# Altium footprint library STM32F0.PcbLib: 228 footprints (part 5 of 16)
Each footprint in its own frame and in the unit in brackets; x right, y up, seen from the top. Pads: shape width x height; smd on the part's side, far side on the other; paste and mask are expansions set on the pad; w line width, h text height; cw(c..) or ccw(c..) is an arc to the next point about the centre after c.
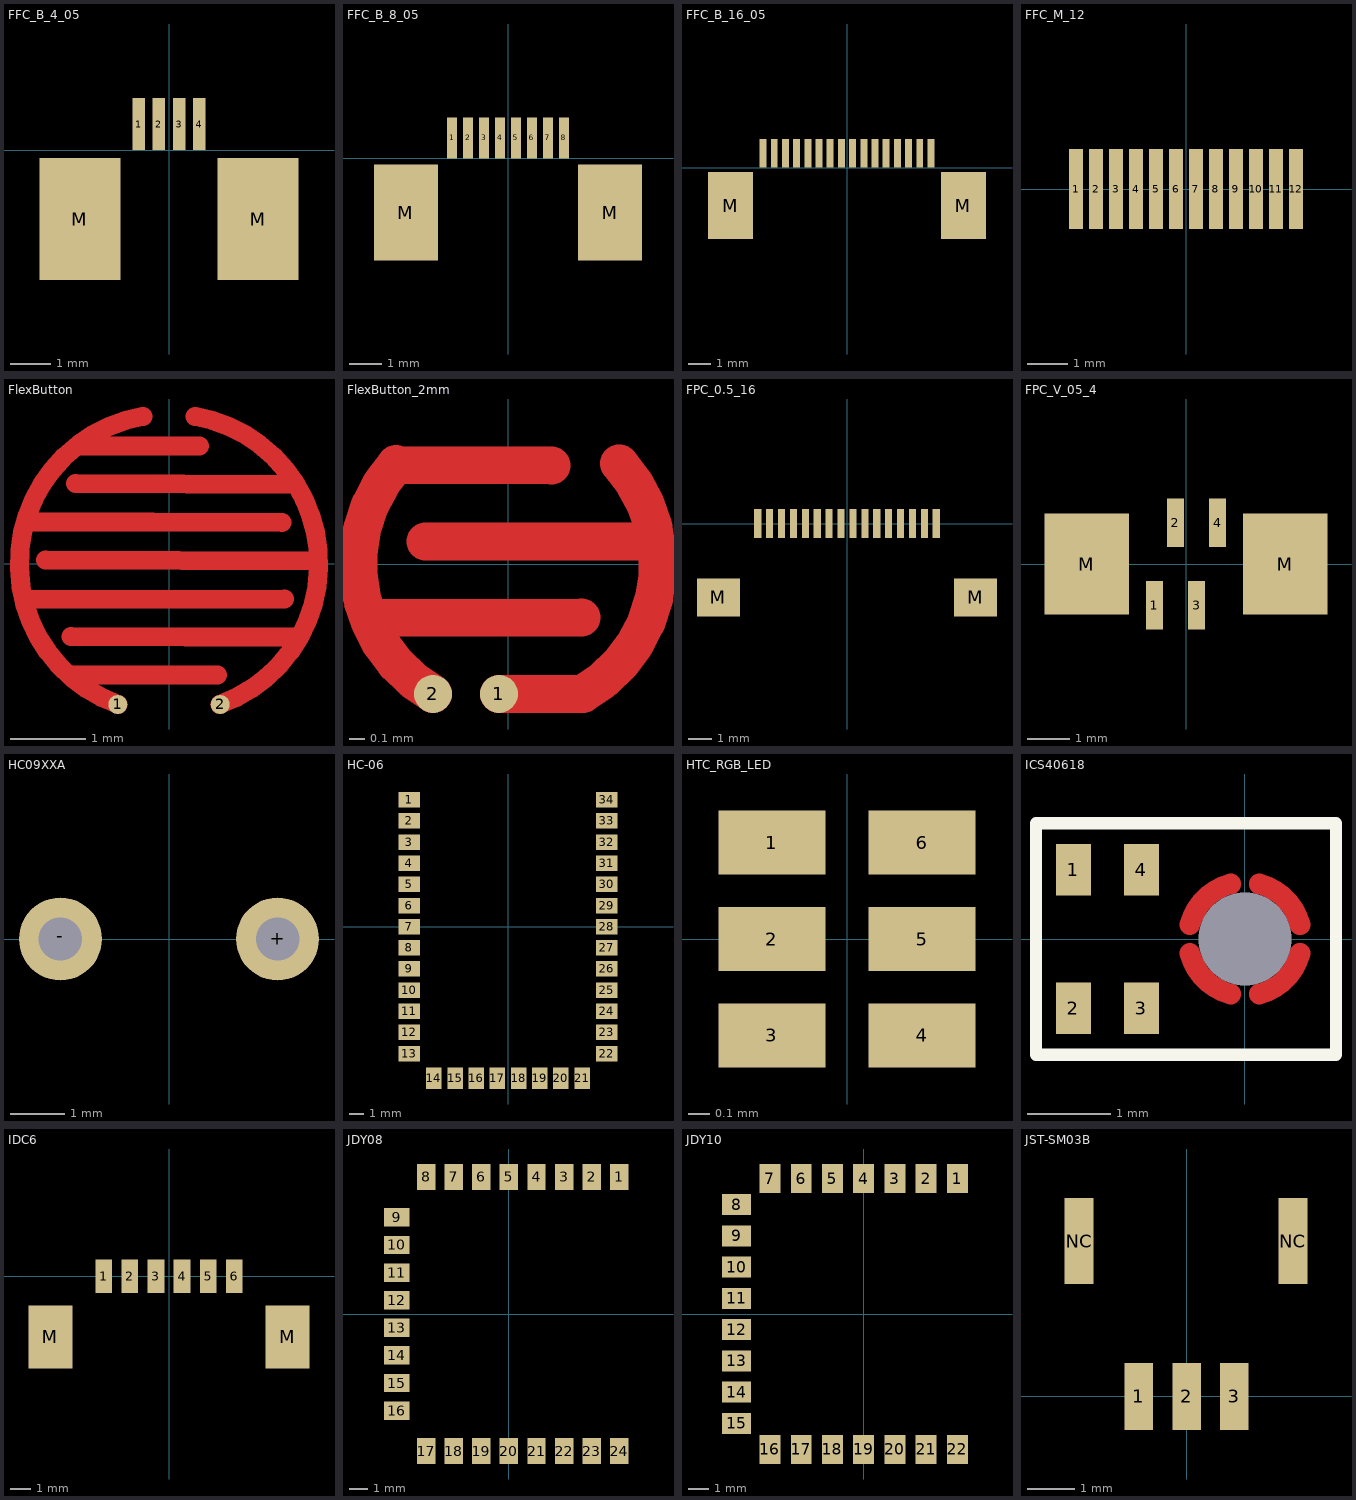
[diagram p4: the footprints below, top view; thin cyan lines are the x and y axes]

## FFC_B_4_05 [mm]
pads (6):
  rect 0.31x1.28 smd: 1(-0.75,0.64) 2(-0.25,0.64) 3(0.25,0.64) 4(0.75,0.64)
  rect 2x3 smd: M(-2.2,-1.7) M(2.2,-1.7)
3D body "52746-0471.stp": height 2, standoff -0.02, extent -4.05,-4.3 4.05,0.7

## FFC_B_8_05 [mm]
pads (10):
  rect 0.31x1.28 smd: 1(-1.75,0.64) 2(-1.25,0.64) 3(-0.75,0.64) 4(-0.25,0.64) 5(0.25,0.64) 6(0.75,0.64) 7(1.25,0.64) 8(1.75,0.64)
  rect 2x3 smd: M(-3.2,-1.7) M(3.2,-1.7)

## FFC_B_16_05 [mm]
pads (18):
  rect 0.31x1.28 smd: 1(-3.75,0.64) 2(-3.25,0.64) 3(-2.75,0.64) 4(-2.25,0.64) 5(-1.75,0.64) 6(-1.25,0.64) 7(-0.75,0.64) 8(-0.25,0.64) 9(0.25,0.64) 10(0.75,0.64) 11(1.25,0.64) 12(1.75,0.64) 13(2.25,0.64) 14(2.75,0.64) 15(3.25,0.64) 16(3.75,0.64)
  rect 2x3 smd: M(-5.2,-1.7) M(5.2,-1.7)

## FFC_M_12 [mm]
pads (12):
  rect 0.35x2 smd: 1(-2.75,0) 2(-2.25,0) 3(-1.75,0) 4(-1.25,0) 5(-0.75,0) 6(-0.25,0) 7(0.25,0) 8(0.75,0) 9(1.25,0) 10(1.75,0) 11(2.25,0) 12(2.75,0)

## FlexButton [mil]
pads (2):
  round 10 smd: 1(-26.93,-73.99) 2(26.93,-73.99)
Top Layer:
  lines w10: -75.98,-18.9 60.63,-18.55 ; -74.8,22.09 59.45,21.67 ; -64.96,1.96 77.16,1.52 ; -51.58,-58.37 25.59,-58.61 ; -51.58,-38.28 67.72,-38.64 ; -49.21,42.1 66.14,41.75 ; -48.43,61.81 16.14,61.99 ; -26.93,-73.99 cw(c0,0) -13.67,77.54 ; 13.67,77.54 cw(c0,0) 26.93,-73.99
Top Paste:
  lines w10: -75.98,-18.9 60.63,-18.55 ; -74.8,22.09 59.45,21.67 ; -64.96,1.96 77.16,1.52 ; -51.58,-58.37 25.59,-58.61 ; -51.58,-38.28 67.72,-38.64 ; -49.21,42.1 66.14,41.75 ; -48.43,61.81 16.14,61.99 ; -26.93,-73.99 cw(c0,0) -13.67,77.54 ; 13.67,77.54 cw(c0,0) 26.93,-73.99
Top Solder:
  lines w10: -75.98,-18.9 60.63,-18.55 ; -74.8,22.09 59.45,21.67 ; -64.96,1.96 77.16,1.52 ; -51.58,-58.37 25.59,-58.61 ; -51.58,-38.28 67.72,-38.64 ; -49.21,42.1 66.14,41.75 ; -48.43,61.81 16.14,61.99 ; -26.93,-73.99 cw(c0,0) -13.67,77.54 ; 13.67,77.54 cw(c0,0) 26.93,-73.99

## FlexButton_2mm [mil]
pads (2):
  round 10 smd mask+4: 1(-2.36,-34.1) 2(-19.69,-34.1)
Top Layer:
  lines w10: -35.43,-14.17 19.29,-14.08 ; -29.38,26.21 ccw(c0,0) -19.69,-34.1 ; -29.13,25.98 11.42,25.87 ; -21.65,5.87 38.58,5.87 ; -2.36,-34.1 19.68,-34.1 ccw(c0,0) 29.2,26.41
Top Paste:
  lines w10: -35.43,-14.17 19.29,-14.08 ; -29.38,26.21 ccw(c0,0) -19.69,-34.1 ; -29.13,25.98 11.42,25.87 ; -21.65,5.87 38.58,5.87 ; -2.36,-34.1 19.68,-34.1 ccw(c0,0) 29.2,26.41
Top Solder:
  lines w10: -35.43,-14.17 19.29,-14.08 ; -29.38,26.21 ccw(c0,0) -19.69,-34.1 ; -29.13,25.98 11.42,25.87 ; -21.65,5.87 38.58,5.87 ; -2.36,-34.1 19.68,-34.1 ccw(c0,0) 29.2,26.41

## FPC_0.5_16 [mm]
pads (18):
  rect 0.3x1.2 smd: 1(-3.75,0) 2(-3.25,0) 3(-2.75,0) 4(-2.25,0) 5(-1.75,0) 6(-1.25,0) 7(-0.75,0) 8(-0.25,0) 9(0.25,0) 10(0.75,0) 11(1.25,0) 12(1.75,0) 13(2.25,0) 14(2.75,0) 15(3.25,0) 16(3.75,0)
  rect 1.8x1.6 smd: M(-5.4,-3.1) M(5.4,-3.1)

## FPC_V_05_4 [mm]
pads (6):
  rect 0.4x1.15 smd: 1(-0.75,-0.975) 2(-0.25,0.975) 3(0.25,-0.975) 4(0.75,0.975)
  rect 2x2.4 smd: M(-2.35,0) M(2.35,0)
3D body "FPC05_4.STEP": height 4.65, standoff 0, extent -4.2,-1.5 4.2,1.5

## HC09XXA [mm]
pads (2):
  round 1.524 hole 0.8: +(2,0) -(-2,0)
3D body "User Library-hc09xxa.step": height 5.01, standoff -3, extent -4.756,-4.756 6.244,4.744

## HC-06 [mm]
pads (34):
  rect 1.524x1.1 smd: 1(-7,9) 2(-7,7.5) 3(-7,6) 4(-7,4.5) 5(-7,3) 6(-7,1.5) 7(-7,0) 8(-7,-1.5) 9(-7,-3) 10(-7,-4.5) 11(-7,-6) 12(-7,-7.5) 13(-7,-9) 22(7,-9) 23(7,-7.5) 24(7,-6) 25(7,-4.5) 26(7,-3) 27(7,-1.5) 28(7,0) 29(7,1.5) 30(7,3) 31(7,4.5) 32(7,6) 33(7,7.5) 34(7,9)
  rect 1.1x1.524 smd: 14(-5.25,-10.75) 15(-3.75,-10.75) 16(-2.25,-10.75) 17(-0.75,-10.75) 18(0.75,-10.75) 19(2.25,-10.75) 20(3.75,-10.75) 21(5.25,-10.75)
3D body "User Library-Bluetooth HC-06_.step": height 2.35, standoff 0, extent -7.01,-10.76 7.01,17.25

## HTC_RGB_LED [mm]
pads (6):
  rect 0.5x0.3 smd: 1(-0.35,0.45) 2(-0.35,0) 3(-0.35,-0.45) 4(0.35,-0.45) 5(0.35,0) 6(0.35,0.45)

## ICS40618 [mm]
pads (5):
  rect 0.422x0.625 smd: 1(-2.074,0.837) 2(-2.074,-0.837) 3(-1.252,-0.837) 4(-1.252,0.837)
  round 0 hole 1.125: 5(0,0)
Top Layer:
  lines w0.25: -0.665,-0.173 ccw(c0,0) -0.173,-0.665 ; -0.665,0.173 cw(c0,0) -0.173,0.665 ; 0.173,-0.665 ccw(c0,0) 0.665,-0.173 ; 0.173,0.665 cw(c0,0) 0.665,0.173
Top Overlay:
  lines w0.15: -2.525,-1.4 -2.525,1.4 1.1,1.4 1.1,-1.4 -2.525,-1.4
Top Paste:
  lines w0.25: -0.665,-0.173 ccw(c0,0) -0.173,-0.665 ; -0.665,0.173 cw(c0,0) -0.173,0.665 ; 0.173,-0.665 ccw(c0,0) 0.665,-0.173 ; 0.173,0.665 cw(c0,0) 0.665,0.173
Top Solder:
  circle w0.28: c0,0 r0.687
3D body "User Library-ICS-40618.step": height 0.98, standoff 0, extent -2.45,-1.325 1.05,1.325

## IDC6 [mm] "Molex 0532610671"
pads (8):
  rect 0.8x1.6 smd: 1(-3.125,0) 2(-1.875,0) 3(-0.625,0) 4(0.625,0) 5(1.875,0) 6(3.125,0)
  rect 2.1x3 smd: M(-5.675,-2.9) M(5.675,-2.9)
3D body "53261-0690.step": height 3.3, standoff -0.1, extent -6.325,-4.7 6.325,0.5

## JDY08 [mm]
pads (24):
  rect 1x1.4 smd: 1(6,7.45) 2(4.5,7.45) 3(3,7.45) 4(1.5,7.45) 5(0,7.45) 6(-1.5,7.45) 7(-3,7.45) 8(-4.5,7.45) 17(-4.5,-7.45) 18(-3,-7.45) 19(-1.5,-7.45) 20(0,-7.45) 21(1.5,-7.45) 22(3,-7.45) 23(4.5,-7.45) 24(6,-7.45)
  rect 1.4x1 smd: 9(-6.1,5.25) 10(-6.1,3.75) 11(-6.1,2.25) 12(-6.1,0.75) 13(-6.1,-0.75) 14(-6.1,-2.25) 15(-6.1,-3.75) 16(-6.1,-5.25)
3D body "JDY10.stp": height 1.5, standoff 0, extent -6,-6.5 12.7,6.5

## JDY10 [mm]
pads (22):
  rect 1x1.4 smd: 1(4.5,6.5) 2(3,6.5) 3(1.5,6.5) 4(0,6.5) 5(-1.5,6.5) 6(-3,6.5) 7(-4.5,6.5) 16(-4.5,-6.5) 17(-3,-6.5) 18(-1.5,-6.5) 19(0,-6.5) 20(1.5,-6.5) 21(3,-6.5) 22(4.5,-6.5)
  rect 1.4x1 smd: 8(-6.1,5.25) 9(-6.1,3.75) 10(-6.1,2.25) 11(-6.1,0.75) 12(-6.1,-0.75) 13(-6.1,-2.25) 14(-6.1,-3.75) 15(-6.1,-5.25)
3D body "JDY10.stp": height 1.5, standoff 0, extent -6,-6.5 12.7,6.5

## JST-SM03B [mm]
pads (5):
  rect 0.6x1.4 smd: 1(-1,0) 2(0,0) 3(1,0)
  rect 0.6x1.8 smd: NC(-2.25,3.25) NC(2.225,3.25)
3D body "User Library-sh03w_asm.STEP": height 3.14, standoff 0, extent -2.525,-0.705 2.475,4.255